# Altium footprint library CPU_STM_080816.PcbLib: 220 footprints (part 14 of 16)
Each footprint in its own frame and in the unit in brackets; x right, y up, seen from the top. Pads: shape width x height; smd on the part's side, far side on the other; paste and mask are expansions set on the pad; w line width, h text height; cw(c..) or ccw(c..) is an arc to the next point about the centre after c.
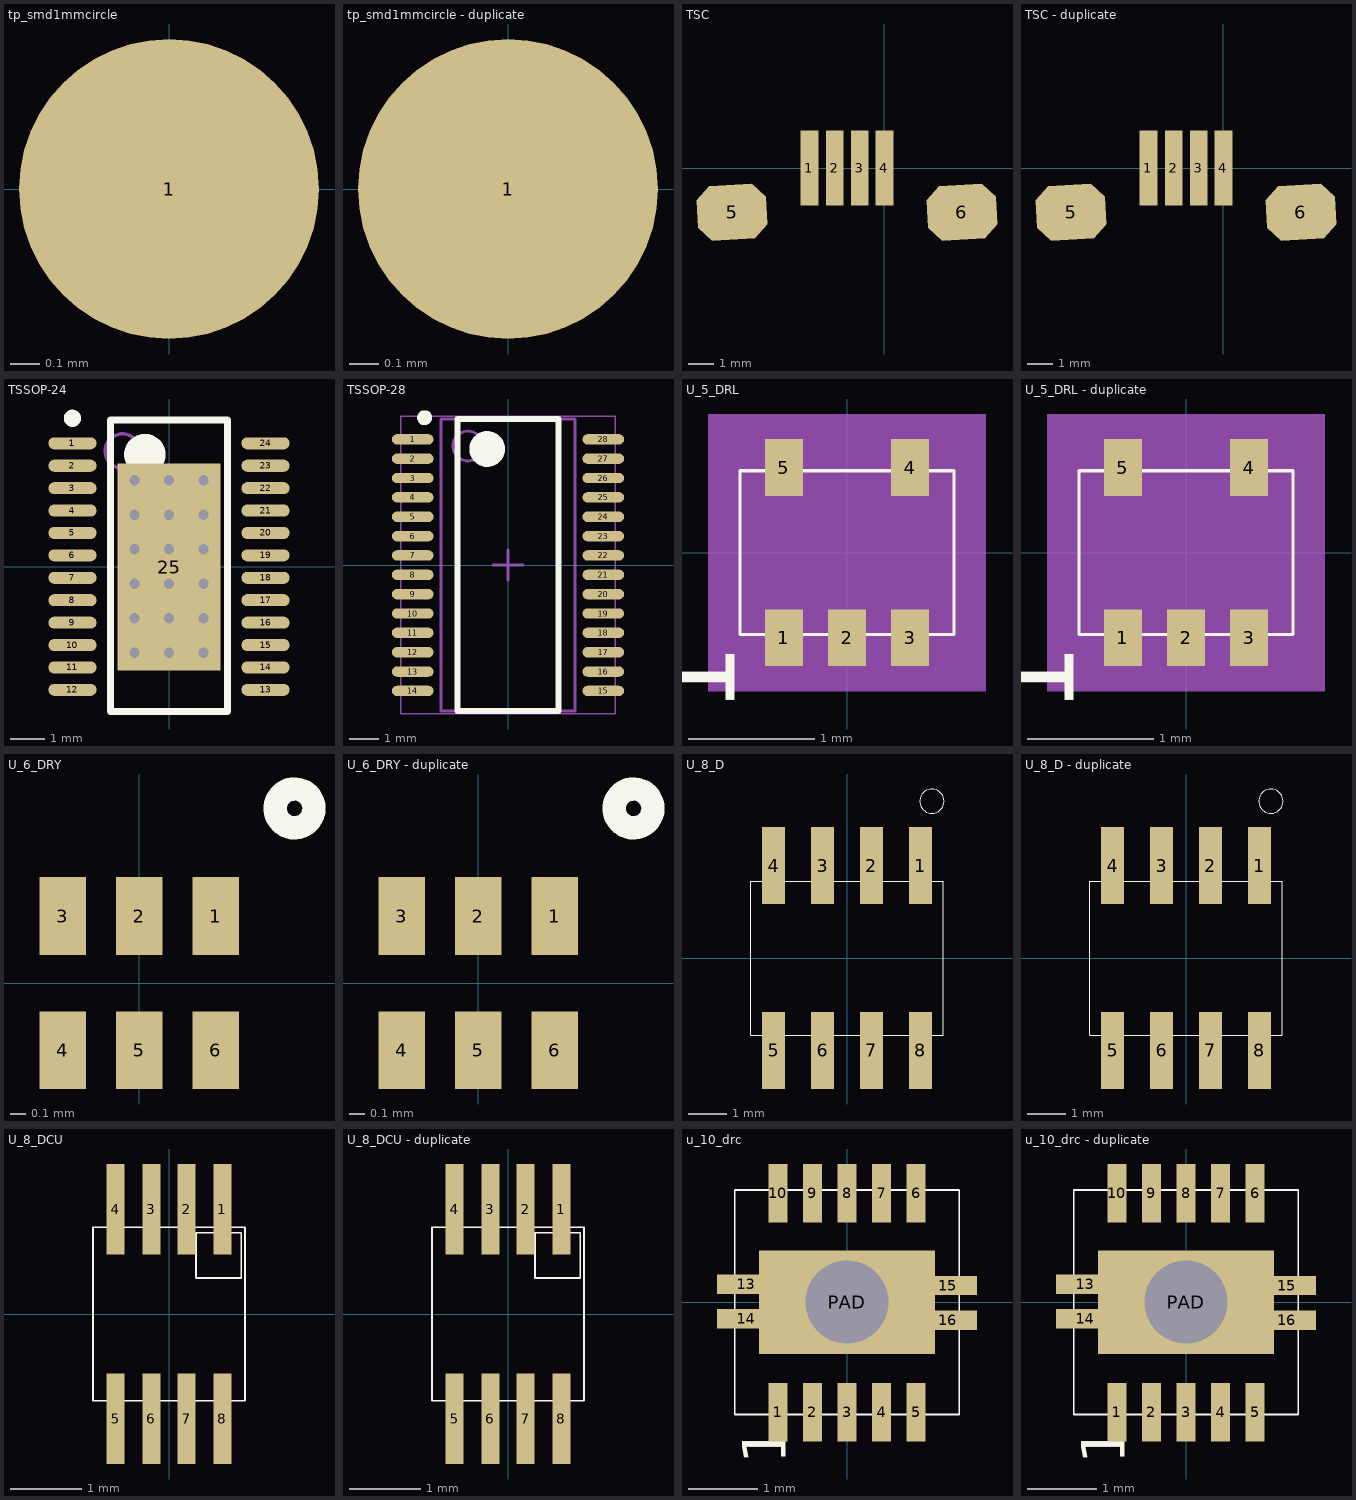
[diagram p13: the footprints below, top view; thin cyan lines are the x and y axes]

## tp_smd1mmcircle [mil] "TP_SMD1MMCIRCLE"
pads (1):
  round 40 smd: 1(0,0)

## tp_smd1mmcircle - duplicate [mil] "TP_SMD1MMCIRCLE"
pads (1):
  round 40 smd: 1(0,0)

## TSC [mm] "CNFPC1X40-0P5MM"
pads (6):
  rect 0.7x3 smd mask+0.06: 1(-3,0) 2(-2,0) 3(-1,0) 4(0,0)
  oct 2.8x2.2 smd rot 3 mask+0.06: 5(-6.1,-1.762) 6(3.1,-1.762)

## TSC - duplicate [mm] "CNFPC1X40-0P5MM"
pads (6):
  rect 0.7x3 smd mask+0.06: 1(-3,0) 2(-2,0) 3(-1,0) 4(0,0)
  oct 2.8x2.2 smd rot 3 mask+0.06: 5(-6.1,-1.762) 6(3.1,-1.762)

## TSSOP-24 [mm]
pads (25):
  oval 1.4x0.35 smd: 1(-2.8,3.575) 2(-2.8,2.925) 3(-2.8,2.275) 4(-2.8,1.625) 5(-2.8,0.975) 6(-2.8,0.325) 7(-2.8,-0.325) 8(-2.8,-0.975) 9(-2.8,-1.625) 10(-2.8,-2.275) 11(-2.8,-2.925) 12(-2.8,-3.575) 13(2.8,-3.575) 14(2.8,-2.925) 15(2.8,-2.275) 16(2.8,-1.625) 17(2.8,-0.975) 18(2.8,-0.325) 19(2.8,0.325) 20(2.8,0.975) 21(2.8,1.625) 22(2.8,2.275) 23(2.8,2.925) 24(2.8,3.575)
  rect 3x6 all layers, no hole: 25(0,-0.015)
via -1,2.5 diameter 0.6 hole 0.3
via 1,-2.5 diameter 0.6 hole 0.3
via 1,-1.5 diameter 0.6 hole 0.3
via 1,-0.5 diameter 0.6 hole 0.3
via 1,0.5 diameter 0.6 hole 0.3
via 1,1.5 diameter 0.6 hole 0.3
via 0,1.5 diameter 0.6 hole 0.3
via 0,0.5 diameter 0.6 hole 0.3
via 0,-0.5 diameter 0.6 hole 0.3
via 0,-1.5 diameter 0.6 hole 0.3
via 0,-2.5 diameter 0.6 hole 0.3
via -1,1.5 diameter 0.6 hole 0.3
via -1,0.5 diameter 0.6 hole 0.3
via -1,-0.5 diameter 0.6 hole 0.3
via -1,-1.5 diameter 0.6 hole 0.3
via -1,-2.5 diameter 0.6 hole 0.3
via 0,2.5 diameter 0.6 hole 0.3
via 1,2.5 diameter 0.6 hole 0.3
Top Overlay:
  circle w0.6: c-0.7,3.25 r0.3
  circle w0.25: c-2.8,4.3 r0.125
  lines w0.2: -1.7,-4.206 1.7,-4.206 1.7,4.25 -1.7,4.25 -1.7,-4.206
Mechanical 13:
  circle w0.1: c-1.35,3.35 r0.5
Mechanical 15:
  lines w0.1: -0.5,-0.65 0.5,-0.65 ; 0,-1.15 0,-0.15
3D body "User Library-User Library-TSSOP-24.step": height 1.2, standoff 0, extent -3.249,-3.94 3.301,3.96

## TSSOP-28 [mm] "TSOP, 28-Leads, Body 9.7x4.4mm, Pitch 0.65mm, IPC High Density"
height 1.2
pads (28):
  oval 1.4x0.35 smd mask+0.18: 1(-3.2,4.225) 2(-3.2,3.575) 3(-3.2,2.925) 4(-3.2,2.275) 5(-3.2,1.625) 6(-3.2,0.975) 7(-3.2,0.325) 8(-3.2,-0.325) 9(-3.2,-0.975) 10(-3.2,-1.625) 11(-3.2,-2.275) 12(-3.2,-2.925) 13(-3.2,-3.575) 14(-3.2,-4.225) 15(3.2,-4.225) 16(3.2,-3.575) 17(3.2,-2.925) 18(3.2,-2.275) 19(3.2,-1.625) 20(3.2,-0.975) 21(3.2,-0.325) 22(3.2,0.325) 23(3.2,0.975) 24(3.2,1.625) 25(3.2,2.275) 26(3.2,2.925) 27(3.2,3.575) 28(3.2,4.225)
Top Overlay:
  circle w0.25: c-2.8,4.95 r0.125
  circle w0.6: c-0.7,3.9 r0.3
  lines w0.2: -1.7,-4.9 -1.7,4.9 1.7,4.9 1.7,-4.9 -1.7,-4.9
Mechanical 13:
  circle w0.1: c-1.35,4 r0.5
  lines w0.1: -2.25,-4.9 -2.25,4.9 2.25,4.9 2.25,-4.9 -2.25,-4.9
Mechanical 15:
  lines w0.05: -3.6,-5 -3.6,5 3.6,5 3.6,-5 -3.6,-5
  lines w0.1: -0.5,0 0.5,0 ; 0,-0.5 0,0.5
3D body "TSSOP-28 9_8x4_4.STEP": height 1.1, standoff 0, extent -3.2,-4.9 3.2,4.9

## U_5_DRL [mm] "U_5_DRL"
pads (5):
  rect 0.3x0.45 smd mask+0.06: 1(-0.5,-0.675) 2(0,-0.675) 3(0.5,-0.675) 4(0.5,0.675) 5(-0.5,0.675)
Top Overlay:
  lines w0.025: -0.85,-0.65 0.85,-0.65 0.85,0.65 -0.85,0.65 -0.85,-0.65
  text "1" at -0.89,-1.28 h0.64
Mechanical 16:
  region: 1.1,1.1 1.1,-1.1 -1.1,-1.1 -1.1,1.1
  lines w0.025: -0.85,-0.65 0.85,-0.65 0.85,0.65 -0.85,0.65 -0.85,-0.65
Mechanical 20:
  text "CHECKED BY:" at 0,-24.892 h0.79
  text "BUILT BY:" at 0,-23.368 h0.79
  text "PAD:" at 0,-21.844 h0.79
  text "SYM:" at 0,-20.447 h0.79
  text "MFG:" at 0,-19.177 h0.79
Mechanical 32:
  text "5" at -0.5,0.421 h0.64
  text "1" at -0.5,-0.929 h0.64
  text "3" at 0.5,-0.929 h0.64
  text "2" at 0,-0.929 h0.64
  text "4" at 0.5,0.421 h0.64
  text "1" at -0.885,-1.282 h0.64

## U_5_DRL - duplicate [mm] "U_5_DRL"
pads (5):
  rect 0.3x0.45 smd mask+0.06: 1(-0.5,-0.675) 2(0,-0.675) 3(0.5,-0.675) 4(0.5,0.675) 5(-0.5,0.675)
Top Overlay:
  lines w0.025: -0.85,-0.65 0.85,-0.65 0.85,0.65 -0.85,0.65 -0.85,-0.65
  text "1" at -0.89,-1.28 h0.64
Mechanical 16:
  region: 1.1,1.1 1.1,-1.1 -1.1,-1.1 -1.1,1.1
  lines w0.025: -0.85,-0.65 0.85,-0.65 0.85,0.65 -0.85,0.65 -0.85,-0.65
Mechanical 20:
  text "CHECKED BY:" at 0,-24.892 h0.79
  text "BUILT BY:" at 0,-23.368 h0.79
  text "PAD:" at 0,-21.844 h0.79
  text "SYM:" at 0,-20.447 h0.79
  text "MFG:" at 0,-19.177 h0.79
Mechanical 32:
  text "5" at -0.5,0.421 h0.64
  text "1" at -0.5,-0.929 h0.64
  text "3" at 0.5,-0.929 h0.64
  text "2" at 0,-0.929 h0.64
  text "4" at 0.5,0.421 h0.64
  text "1" at -0.885,-1.282 h0.64

## U_6_DRY [mil] "U_6_DRY"
pads (6):
  rect 12x20 smd mask+2.36: 1(19.68,17.28) 2(0,17.28) 3(-19.68,17.28) 4(-19.68,-17.28) 5(0,-17.28) 6(19.68,-17.28)
Top Overlay:
  circle w6: c40,45 r5

## U_6_DRY - duplicate [mil] "U_6_DRY"
pads (6):
  rect 12x20 smd mask+2.36: 1(19.68,17.28) 2(0,17.28) 3(-19.68,17.28) 4(-19.68,-17.28) 5(0,-17.28) 6(19.68,-17.28)
Top Overlay:
  circle w6: c40,45 r5

## U_8_D [mm] "U_8_D"
pads (8):
  rect 0.6x2 smd: 1(1.905,2.4) 2(0.635,2.4) 3(-0.635,2.4) 4(-1.905,2.4) 5(-1.905,-2.4) 6(-0.635,-2.4) 7(0.635,-2.4) 8(1.905,-2.4)
Top Overlay:
  circle w0.025: c2.205,4.075 r0.316
  lines w0.025: -2.5,-2 2.5,-2 2.5,2 -2.5,2 -2.5,-2

## U_8_D - duplicate [mm] "U_8_D"
pads (8):
  rect 0.6x2 smd: 1(1.905,2.4) 2(0.635,2.4) 3(-0.635,2.4) 4(-1.905,2.4) 5(-1.905,-2.4) 6(-0.635,-2.4) 7(0.635,-2.4) 8(1.905,-2.4)
Top Overlay:
  circle w0.025: c2.205,4.075 r0.316
  lines w0.025: -2.5,-2 2.5,-2 2.5,2 -2.5,2 -2.5,-2

## U_8_DCU [mil] "U_8_DCU"
pads (8):
  rect 10x50 smd mask+2.36: 1(29.5,58) 2(9.8,58) 3(-9.8,58) 4(-29.5,58) 5(-29.5,-58) 6(-9.8,-58) 7(9.8,-58) 8(29.5,-58)
Top Overlay:
  lines w1: -42,-48 -42,48 42,48 42,-48 -42,-48 ; 15,20 15,45 40,45 40,20 15,20

## U_8_DCU - duplicate [mil] "U_8_DCU"
pads (8):
  rect 10x50 smd mask+2.36: 1(29.5,58) 2(9.8,58) 3(-9.8,58) 4(-29.5,58) 5(-29.5,-58) 6(-9.8,-58) 7(9.8,-58) 8(29.5,-58)
Top Overlay:
  lines w1: -42,-48 -42,48 42,48 42,-48 -42,-48 ; 15,20 15,45 40,45 40,20 15,20

## u_10_drc [mm] "U_10_DRC"
pads (15):
  rect 0.28x0.85 smd mask+0.06: 1(-1,-1.595) 2(-0.5,-1.595) 3(0,-1.595) 4(0.5,-1.595) 5(1,-1.595) 6(1,1.575) 7(0.5,1.575) 8(0,1.575) 9(-0.5,1.575) 10(-1,1.575)
  rect 0.85x0.28 smd mask+0.06: 13(-1.46,0.26) 14(-1.46,-0.24) 15(1.46,0.24) 16(1.46,-0.26)
  rect 2.55x1.5 hole 1.2 square: PAD(0,0)
Top Overlay:
  lines w0.025: -1.625,0 -1.625,-1.625 ; 0,-1.625 -1.625,-1.625 ; -1.625,-1.625 -1.625,1.625 1.625,1.625 1.625,-1.625 -1.625,-1.625
  text "1" at -0.889,-2.343 h0.64
Top Paste:
  pour cut-out: -0.11,0.79 -1.16,0.79 -1.16,0.11 -0.11,0.11
  pour cut-out: 1.16,0.79 0.11,0.79 0.11,0.11 1.16,0.11
  pour cut-out: 1.16,-0.11 0.11,-0.11 0.11,-0.79 1.16,-0.79
  pour cut-out: -0.11,-0.11 -1.16,-0.11 -1.16,-0.79 -0.11,-0.79
  pour cut-out: -1.38,0.38 -1.88,0.38 -1.88,0.12 -1.38,0.12
  pour cut-out: -1.38,-0.12 -1.88,-0.12 -1.88,-0.38 -1.38,-0.38
  pour cut-out: 1.88,0.38 1.38,0.38 1.38,0.12 1.88,0.12
  pour cut-out: 1.88,-0.12 1.38,-0.12 1.38,-0.38 1.88,-0.38

## u_10_drc - duplicate [mm] "U_10_DRC"
pads (15):
  rect 0.28x0.85 smd mask+0.06: 1(-1,-1.595) 2(-0.5,-1.595) 3(0,-1.595) 4(0.5,-1.595) 5(1,-1.595) 6(1,1.575) 7(0.5,1.575) 8(0,1.575) 9(-0.5,1.575) 10(-1,1.575)
  rect 0.85x0.28 smd mask+0.06: 13(-1.46,0.26) 14(-1.46,-0.24) 15(1.46,0.24) 16(1.46,-0.26)
  rect 2.55x1.5 hole 1.2 square: PAD(0,0)
Top Overlay:
  lines w0.025: -1.625,0 -1.625,-1.625 ; 0,-1.625 -1.625,-1.625 ; -1.625,-1.625 -1.625,1.625 1.625,1.625 1.625,-1.625 -1.625,-1.625
  text "1" at -0.889,-2.343 h0.64
Top Paste:
  pour cut-out: -0.11,0.79 -1.16,0.79 -1.16,0.11 -0.11,0.11
  pour cut-out: 1.16,0.79 0.11,0.79 0.11,0.11 1.16,0.11
  pour cut-out: 1.16,-0.11 0.11,-0.11 0.11,-0.79 1.16,-0.79
  pour cut-out: -0.11,-0.11 -1.16,-0.11 -1.16,-0.79 -0.11,-0.79
  pour cut-out: -1.38,0.38 -1.88,0.38 -1.88,0.12 -1.38,0.12
  pour cut-out: -1.38,-0.12 -1.88,-0.12 -1.88,-0.38 -1.38,-0.38
  pour cut-out: 1.88,0.38 1.38,0.38 1.38,0.12 1.88,0.12
  pour cut-out: 1.88,-0.12 1.38,-0.12 1.38,-0.38 1.88,-0.38